# Altium schematic symbol library jlcpcb_2025_04_capacitors_extended_0805.schlib: 3281 symbols (part 5 of 18) (continued)
## AC0805JRNPO0BN100 (continued)

## AC0805JRNPO0BN101
designator C?  Capacitance: 100pF  (hidden comment: *)
Capacitor, Ceramic (MLCC), 100pF, ±5%, 100V, ±5%, SMD 0805; Manufacturer: YAGEO; Manufacturer Part Number: AC0805JRNPO0BN101; Package Size: 0805; JLCPCB Basic Part: No; JLCPCB Part Number: C726569; Supplier 1: LCSC; Category: Capacitors - MLCC; Supplier Part Number 1: C726569; Tolerance: ±5%; Voltage Rating: 100V; RoHS: Yes; ComponentLink1Description: Datasheet; ComponentLink1URL: https://wmsc.lcsc.com/wmsc/upload/file/pdf/v2/lcsc/2105241410_YAGEO-AC0805JRNPO0BN101_C726569.pdf; ComponentLink2Description: JLCPCB Part URL; ComponentLink2URL: https://jlcpcb.com/partdetail/C726569; ComponentLink3Description: LCSC Part URL; ComponentLink3URL: https://lcsc.com/product-detail/Multilayer-Ceramic-Capacitors-MLCC---SMD-SMT_YAGEO-YAGEO-AC0805JRNPO0BN101_C726569.html
footprint CAP-0805 (0805 (2012M) Capacitor)
pins: 1, 2

## AC0805JRNPO0BN102
designator C?  Capacitance: 1nF  (hidden comment: *)
Capacitor, Ceramic (MLCC), 1nF, ±5%, 100V, NP0, ±5%, SMD 0805; Manufacturer: YAGEO; Manufacturer Part Number: AC0805JRNPO0BN102; Package Size: 0805; JLCPCB Basic Part: No; JLCPCB Part Number: C726570; Supplier 1: LCSC; Category: Capacitors - MLCC; Supplier Part Number 1: C726570; Tolerance: ±5%; Voltage Rating: 100V; Temperature Coefficient: NP0; RoHS: Yes; ComponentLink1Description: Datasheet; ComponentLink1URL: https://wmsc.lcsc.com/wmsc/upload/file/pdf/v2/lcsc/2009181007_YAGEO-AC0805JRNPO0BN102_C726570.pdf; ComponentLink2Description: JLCPCB Part URL; ComponentLink2URL: https://jlcpcb.com/partdetail/C726570; ComponentLink3Description: LCSC Part URL; ComponentLink3URL: https://lcsc.com/product-detail/Multilayer-Ceramic-Capacitors-MLCC---SMD-SMT_YAGEO-YAGEO-AC0805JRNPO0BN102_C726570.html
footprint CAP-0805 (0805 (2012M) Capacitor)
pins: 1, 2

## AC0805JRNPO0BN151
designator C?  Capacitance: 150pF  (hidden comment: *)
Capacitor, Ceramic (MLCC), 150pF, ±5%, 100V, NP0, ±5%, SMD 0805; Manufacturer: YAGEO; Manufacturer Part Number: AC0805JRNPO0BN151; Package Size: 0805; JLCPCB Basic Part: No; JLCPCB Part Number: C2216343; Supplier 1: LCSC; Category: Capacitors - MLCC; Supplier Part Number 1: C2216343; Tolerance: ±5%; Voltage Rating: 100V; Temperature Coefficient: NP0; RoHS: Yes; ComponentLink1Description: Datasheet; ComponentLink1URL: https://wmsc.lcsc.com/wmsc/upload/file/pdf/v2/lcsc/2304140030_YAGEO-AC0805JRNPO0BN151_C2216343.pdf; ComponentLink2Description: JLCPCB Part URL; ComponentLink2URL: https://jlcpcb.com/partdetail/C2216343; ComponentLink3Description: LCSC Part URL; ComponentLink3URL: https://lcsc.com/product-detail/Multilayer-Ceramic-Capacitors-MLCC---SMD-SMT_YAGEO-YAGEO-AC0805JRNPO0BN151_C2216343.html
footprint CAP-0805 (0805 (2012M) Capacitor)
pins: 1, 2

## AC0805JRNPO0BN221
designator C?  Capacitance: 220pF  (hidden comment: *)
Capacitor, Ceramic (MLCC), 220pF, ±5%, 100V, NP0, ±5%, SMD 0805; Manufacturer: YAGEO; Manufacturer Part Number: AC0805JRNPO0BN221; Package Size: 0805; JLCPCB Basic Part: No; JLCPCB Part Number: C726571; Supplier 1: LCSC; Category: Capacitors - MLCC; Supplier Part Number 1: C726571; Tolerance: ±5%; Voltage Rating: 100V; Temperature Coefficient: NP0; RoHS: Yes; ComponentLink1Description: Datasheet; ComponentLink1URL: https://wmsc.lcsc.com/wmsc/upload/file/pdf/v2/lcsc/2009181007_YAGEO-AC0805JRNPO0BN221_C726571.pdf; ComponentLink2Description: JLCPCB Part URL; ComponentLink2URL: https://jlcpcb.com/partdetail/C726571; ComponentLink3Description: LCSC Part URL; ComponentLink3URL: https://lcsc.com/product-detail/Multilayer-Ceramic-Capacitors-MLCC---SMD-SMT_YAGEO-YAGEO-AC0805JRNPO0BN221_C726571.html
footprint CAP-0805 (0805 (2012M) Capacitor)
pins: 1, 2

## AC0805JRNPO0BN330
designator C?  Capacitance: 33pF  (hidden comment: *)
Capacitor, Ceramic (MLCC), 33pF, ±5%, 100V, NP0, ±5%, SMD 0805; Manufacturer: YAGEO; Manufacturer Part Number: AC0805JRNPO0BN330; Package Size: 0805; JLCPCB Basic Part: No; JLCPCB Part Number: C2203727; Supplier 1: LCSC; Category: Capacitors - MLCC; Supplier Part Number 1: C2203727; Tolerance: ±5%; Voltage Rating: 100V; Temperature Coefficient: NP0; RoHS: Yes; ComponentLink1Description: Datasheet; ComponentLink1URL: https://wmsc.lcsc.com/wmsc/upload/file/pdf/v2/lcsc/2304140030_YAGEO-AC0805JRNPO0BN330_C2203727.pdf; ComponentLink2Description: JLCPCB Part URL; ComponentLink2URL: https://jlcpcb.com/partdetail/C2203727; ComponentLink3Description: LCSC Part URL; ComponentLink3URL: https://lcsc.com/product-detail/Multilayer-Ceramic-Capacitors-MLCC---SMD-SMT_YAGEO-YAGEO-AC0805JRNPO0BN330_C2203727.html
footprint CAP-0805 (0805 (2012M) Capacitor)
pins: 1, 2

## AC0805JRNPO0BN331
designator C?  Capacitance: 330pF  (hidden comment: *)
Capacitor, Ceramic (MLCC), 330pF, ±5%, 100V, NP0, ±5%, SMD 0805; Manufacturer: YAGEO; Manufacturer Part Number: AC0805JRNPO0BN331; Package Size: 0805; JLCPCB Basic Part: No; JLCPCB Part Number: C149605; Supplier 1: LCSC; Category: Capacitors - MLCC; Supplier Part Number 1: C149605; Tolerance: ±5%; Voltage Rating: 100V; Temperature Coefficient: NP0; RoHS: Yes; ComponentLink1Description: Datasheet; ComponentLink1URL: https://wmsc.lcsc.com/wmsc/upload/file/pdf/v2/lcsc/2304140030_YAGEO-AC0805JRNPO0BN331_C149605.pdf; ComponentLink2Description: JLCPCB Part URL; ComponentLink2URL: https://jlcpcb.com/partdetail/C149605; ComponentLink3Description: LCSC Part URL; ComponentLink3URL: https://lcsc.com/product-detail/Multilayer-Ceramic-Capacitors-MLCC---SMD-SMT_YAGEO-YAGEO-AC0805JRNPO0BN331_C149605.html
footprint CAP-0805 (0805 (2012M) Capacitor)
pins: 1, 2

## AC0805JRNPO0BN470
designator C?  Capacitance: 47pF  (hidden comment: *)
Capacitor, Ceramic (MLCC), 47pF, ±5%, 100V, NP0, ±5%, SMD 0805; Manufacturer: YAGEO; Manufacturer Part Number: AC0805JRNPO0BN470; Package Size: 0805; JLCPCB Basic Part: No; JLCPCB Part Number: C726572; Supplier 1: LCSC; Category: Capacitors - MLCC; Supplier Part Number 1: C726572; Tolerance: ±5%; Voltage Rating: 100V; Temperature Coefficient: NP0; RoHS: Yes; ComponentLink1Description: Datasheet; ComponentLink1URL: https://wmsc.lcsc.com/wmsc/upload/file/pdf/v2/lcsc/2011091835_YAGEO-AC0805JRNPO0BN470_C726572.pdf; ComponentLink2Description: JLCPCB Part URL; ComponentLink2URL: https://jlcpcb.com/partdetail/C726572; ComponentLink3Description: LCSC Part URL; ComponentLink3URL: https://lcsc.com/product-detail/Multilayer-Ceramic-Capacitors-MLCC---SMD-SMT_YAGEO-YAGEO-AC0805JRNPO0BN470_C726572.html
footprint CAP-0805 (0805 (2012M) Capacitor)
pins: 1, 2

## AC0805JRNPO0BN471
designator C?  Capacitance: 470pF  (hidden comment: *)
Capacitor, Ceramic (MLCC), 470pF, ±5%, 100V, NP0, ±5%, SMD 0805; Manufacturer: YAGEO; Manufacturer Part Number: AC0805JRNPO0BN471; Package Size: 0805; JLCPCB Basic Part: No; JLCPCB Part Number: C2173436; Supplier 1: LCSC; Category: Capacitors - MLCC; Supplier Part Number 1: C2173436; Tolerance: ±5%; Voltage Rating: 100V; Temperature Coefficient: NP0; RoHS: Yes; ComponentLink1Description: Datasheet; ComponentLink1URL: https://wmsc.lcsc.com/wmsc/upload/file/pdf/v2/lcsc/2202040630_YAGEO-AC0805JRNPO0BN471_C2173436.pdf; ComponentLink2Description: JLCPCB Part URL; ComponentLink2URL: https://jlcpcb.com/partdetail/C2173436; ComponentLink3Description: LCSC Part URL; ComponentLink3URL: https://lcsc.com/product-detail/Multilayer-Ceramic-Capacitors-MLCC---SMD-SMT_YAGEO-YAGEO-AC0805JRNPO0BN471_C2173436.html
footprint CAP-0805 (0805 (2012M) Capacitor)
pins: 1, 2

## AC0805JRNPO0BN680
designator C?  Capacitance: 68pF  (hidden comment: *)
Capacitor, Ceramic (MLCC), 68pF, ±5%, 100V, NP0, ±5%, SMD 0805; Manufacturer: YAGEO; Manufacturer Part Number: AC0805JRNPO0BN680; Package Size: 0805; JLCPCB Basic Part: No; JLCPCB Part Number: C726573; Supplier 1: LCSC; Category: Capacitors - MLCC; Supplier Part Number 1: C726573; Tolerance: ±5%; Voltage Rating: 100V; Temperature Coefficient: NP0; RoHS: Yes; ComponentLink1Description: Datasheet; ComponentLink1URL: https://wmsc.lcsc.com/wmsc/upload/file/pdf/v2/lcsc/2011091835_YAGEO-AC0805JRNPO0BN680_C726573.pdf; ComponentLink2Description: JLCPCB Part URL; ComponentLink2URL: https://jlcpcb.com/partdetail/C726573; ComponentLink3Description: LCSC Part URL; ComponentLink3URL: https://lcsc.com/product-detail/Multilayer-Ceramic-Capacitors-MLCC---SMD-SMT_YAGEO-YAGEO-AC0805JRNPO0BN680_C726573.html
footprint CAP-0805 (0805 (2012M) Capacitor)
pins: 1, 2

## AC0805JRNPO9BN100
designator C?  Capacitance: 10pF  (hidden comment: *)
Capacitor, Ceramic (MLCC), 10pF, ±5%, 50V, ±5%, SMD 0805; Manufacturer: YAGEO; Manufacturer Part Number: AC0805JRNPO9BN100; Package Size: 0805; JLCPCB Basic Part: No; JLCPCB Part Number: C726574; Supplier 1: LCSC; Category: Capacitors - MLCC; Supplier Part Number 1: C726574; Tolerance: ±5%; Voltage Rating: 50V; RoHS: Yes; ComponentLink1Description: Datasheet; ComponentLink1URL: https://wmsc.lcsc.com/wmsc/upload/file/pdf/v2/lcsc/2012102146_YAGEO-AC0805JRNPO9BN100_C726574.pdf; ComponentLink2Description: JLCPCB Part URL; ComponentLink2URL: https://jlcpcb.com/partdetail/C726574; ComponentLink3Description: LCSC Part URL; ComponentLink3URL: https://lcsc.com/product-detail/Multilayer-Ceramic-Capacitors-MLCC---SMD-SMT_YAGEO-YAGEO-AC0805JRNPO9BN100_C726574.html
footprint CAP-0805 (0805 (2012M) Capacitor)
pins: 1, 2

## AC0805JRNPO9BN101
designator C?  Capacitance: 100pF  (hidden comment: *)
Capacitor, Ceramic (MLCC), 100pF, ±5%, 50V, NP0, ±5%, SMD 0805; Manufacturer: YAGEO; Manufacturer Part Number: AC0805JRNPO9BN101; Package Size: 0805; JLCPCB Basic Part: No; JLCPCB Part Number: C326819; Supplier 1: LCSC; Category: Capacitors - MLCC; Supplier Part Number 1: C326819; Tolerance: ±5%; Voltage Rating: 50V; Temperature Coefficient: NP0; RoHS: Yes; ComponentLink1Description: Datasheet; ComponentLink1URL: https://wmsc.lcsc.com/wmsc/upload/file/pdf/v2/lcsc/1811141234_YAGEO-AC0805JRNPO9BN101_C326819.pdf; ComponentLink2Description: JLCPCB Part URL; ComponentLink2URL: https://jlcpcb.com/partdetail/C326819; ComponentLink3Description: LCSC Part URL; ComponentLink3URL: https://lcsc.com/product-detail/Multilayer-Ceramic-Capacitors-MLCC---SMD-SMT_YAGEO-YAGEO-AC0805JRNPO9BN101_C326819.html
footprint CAP-0805 (0805 (2012M) Capacitor)
pins: 1, 2

## AC0805JRNPO9BN102
designator C?  Capacitance: 1nF  (hidden comment: *)
Capacitor, Ceramic (MLCC), 1nF, ±5%, 50V, ±5%, SMD 0805; Manufacturer: YAGEO; Manufacturer Part Number: AC0805JRNPO9BN102; Package Size: 0805; JLCPCB Basic Part: No; JLCPCB Part Number: C726575; Supplier 1: LCSC; Category: Capacitors - MLCC; Supplier Part Number 1: C726575; Tolerance: ±5%; Voltage Rating: 50V; RoHS: Yes; ComponentLink1Description: Datasheet; ComponentLink1URL: https://wmsc.lcsc.com/wmsc/upload/file/pdf/v2/lcsc/2105241410_YAGEO-AC0805JRNPO9BN102_C726575.pdf; ComponentLink2Description: JLCPCB Part URL; ComponentLink2URL: https://jlcpcb.com/partdetail/C726575; ComponentLink3Description: LCSC Part URL; ComponentLink3URL: https://lcsc.com/product-detail/Multilayer-Ceramic-Capacitors-MLCC---SMD-SMT_YAGEO-YAGEO-AC0805JRNPO9BN102_C726575.html
footprint CAP-0805 (0805 (2012M) Capacitor)
pins: 1, 2

## AC0805JRNPO9BN120
designator C?  Capacitance: 12pF  (hidden comment: *)
Capacitor, Ceramic (MLCC), 12pF, ±5%, 50V, NP0, ±5%, SMD 0805; Manufacturer: YAGEO; Manufacturer Part Number: AC0805JRNPO9BN120; Package Size: 0805; JLCPCB Basic Part: No; JLCPCB Part Number: C2197922; Supplier 1: LCSC; Category: Capacitors - MLCC; Supplier Part Number 1: C2197922; Tolerance: ±5%; Voltage Rating: 50V; Temperature Coefficient: NP0; RoHS: Yes; ComponentLink1Description: Datasheet; ComponentLink1URL: https://wmsc.lcsc.com/wmsc/upload/file/pdf/v2/lcsc/2304140030_YAGEO-AC0805JRNPO9BN120_C2197922.pdf; ComponentLink2Description: JLCPCB Part URL; ComponentLink2URL: https://jlcpcb.com/partdetail/C2197922; ComponentLink3Description: LCSC Part URL; ComponentLink3URL: https://lcsc.com/product-detail/Multilayer-Ceramic-Capacitors-MLCC---SMD-SMT_YAGEO-YAGEO-AC0805JRNPO9BN120_C2197922.html
footprint CAP-0805 (0805 (2012M) Capacitor)
pins: 1, 2

## AC0805JRNPO9BN150
designator C?  Capacitance: 15pF  (hidden comment: *)
Capacitor, Ceramic (MLCC), 15pF, ±5%, 50V, NP0, ±5%, SMD 0805; Manufacturer: YAGEO; Manufacturer Part Number: AC0805JRNPO9BN150; Package Size: 0805; JLCPCB Basic Part: No; JLCPCB Part Number: C705013; Supplier 1: LCSC; Category: Capacitors - MLCC; Supplier Part Number 1: C705013; Tolerance: ±5%; Voltage Rating: 50V; Temperature Coefficient: NP0; RoHS: Yes; ComponentLink1Description: Datasheet; ComponentLink1URL: https://wmsc.lcsc.com/wmsc/upload/file/pdf/v2/lcsc/2304140030_YAGEO-AC0805JRNPO9BN150_C705013.pdf; ComponentLink2Description: JLCPCB Part URL; ComponentLink2URL: https://jlcpcb.com/partdetail/C705013; ComponentLink3Description: LCSC Part URL; ComponentLink3URL: https://lcsc.com/product-detail/Multilayer-Ceramic-Capacitors-MLCC---SMD-SMT_YAGEO-YAGEO-AC0805JRNPO9BN150_C705013.html
footprint CAP-0805 (0805 (2012M) Capacitor)
pins: 1, 2

## AC0805JRNPO9BN151
designator C?  Capacitance: 150pF  (hidden comment: *)
Capacitor, Ceramic (MLCC), 150pF, ±5%, 50V, NP0, ±5%, SMD 0805; Manufacturer: YAGEO; Manufacturer Part Number: AC0805JRNPO9BN151; Package Size: 0805; JLCPCB Basic Part: No; JLCPCB Part Number: C2216334; Supplier 1: LCSC; Category: Capacitors - MLCC; Supplier Part Number 1: C2216334; Tolerance: ±5%; Voltage Rating: 50V; Temperature Coefficient: NP0; RoHS: Yes; ComponentLink1Description: Datasheet; ComponentLink1URL: https://wmsc.lcsc.com/wmsc/upload/file/pdf/v2/lcsc/2304140030_YAGEO-AC0805JRNPO9BN151_C2216334.pdf; ComponentLink2Description: JLCPCB Part URL; ComponentLink2URL: https://jlcpcb.com/partdetail/C2216334; ComponentLink3Description: LCSC Part URL; ComponentLink3URL: https://lcsc.com/product-detail/Multilayer-Ceramic-Capacitors-MLCC---SMD-SMT_YAGEO-YAGEO-AC0805JRNPO9BN151_C2216334.html
footprint CAP-0805 (0805 (2012M) Capacitor)
pins: 1, 2

## AC0805JRNPO9BN180
designator C?  Capacitance: 18pF  (hidden comment: *)
Capacitor, Ceramic (MLCC), 18pF, ±5%, 50V, NP0, ±5%, SMD 0805; Manufacturer: YAGEO; Manufacturer Part Number: AC0805JRNPO9BN180; Package Size: 0805; JLCPCB Basic Part: No; JLCPCB Part Number: C726576; Supplier 1: LCSC; Category: Capacitors - MLCC; Supplier Part Number 1: C726576; Tolerance: ±5%; Voltage Rating: 50V; Temperature Coefficient: NP0; RoHS: Yes; ComponentLink1Description: Datasheet; ComponentLink1URL: https://wmsc.lcsc.com/wmsc/upload/file/pdf/v2/lcsc/2010221004_YAGEO-AC0805JRNPO9BN180_C726576.pdf; ComponentLink2Description: JLCPCB Part URL; ComponentLink2URL: https://jlcpcb.com/partdetail/C726576; ComponentLink3Description: LCSC Part URL; ComponentLink3URL: https://lcsc.com/product-detail/Multilayer-Ceramic-Capacitors-MLCC---SMD-SMT_YAGEO-YAGEO-AC0805JRNPO9BN180_C726576.html
footprint CAP-0805 (0805 (2012M) Capacitor)
pins: 1, 2

## AC0805JRNPO9BN200
designator C?  Capacitance: 20pF  (hidden comment: *)
Capacitor, Ceramic (MLCC), 20pF, ±5%, 50V, NP0, ±5%, SMD 0805; Manufacturer: YAGEO; Manufacturer Part Number: AC0805JRNPO9BN200; Package Size: 0805; JLCPCB Basic Part: No; JLCPCB Part Number: C149606; Supplier 1: LCSC; Category: Capacitors - MLCC; Supplier Part Number 1: C149606; Tolerance: ±5%; Voltage Rating: 50V; Temperature Coefficient: NP0; RoHS: Yes; ComponentLink1Description: Datasheet; ComponentLink1URL: https://wmsc.lcsc.com/wmsc/upload/file/pdf/v2/lcsc/2304140030_YAGEO-AC0805JRNPO9BN200_C149606.pdf; ComponentLink2Description: JLCPCB Part URL; ComponentLink2URL: https://jlcpcb.com/partdetail/C149606; ComponentLink3Description: LCSC Part URL; ComponentLink3URL: https://lcsc.com/product-detail/Multilayer-Ceramic-Capacitors-MLCC---SMD-SMT_YAGEO-YAGEO-AC0805JRNPO9BN200_C149606.html
footprint CAP-0805 (0805 (2012M) Capacitor)
pins: 1, 2

## AC0805JRNPO9BN220
designator C?  Capacitance: 22pF  (hidden comment: *)
Capacitor, Ceramic (MLCC), 22pF, ±5%, 50V, NP0, ±5%, SMD 0805; Manufacturer: YAGEO; Manufacturer Part Number: AC0805JRNPO9BN220; Package Size: 0805; JLCPCB Basic Part: No; JLCPCB Part Number: C149614; Supplier 1: LCSC; Category: Capacitors - MLCC; Supplier Part Number 1: C149614; Tolerance: ±5%; Voltage Rating: 50V; Temperature Coefficient: NP0; RoHS: Yes; ComponentLink1Description: Datasheet; ComponentLink1URL: https://wmsc.lcsc.com/wmsc/upload/file/pdf/v2/lcsc/2304140030_YAGEO-AC0805JRNPO9BN220_C149614.pdf; ComponentLink2Description: JLCPCB Part URL; ComponentLink2URL: https://jlcpcb.com/partdetail/C149614; ComponentLink3Description: LCSC Part URL; ComponentLink3URL: https://lcsc.com/product-detail/Multilayer-Ceramic-Capacitors-MLCC---SMD-SMT_YAGEO-YAGEO-AC0805JRNPO9BN220_C149614.html
footprint CAP-0805 (0805 (2012M) Capacitor)
pins: 1, 2

## AC0805JRNPO9BN270
designator C?  Capacitance: 27pF  (hidden comment: *)
Capacitor, Ceramic (MLCC), 27pF, ±5%, 50V, NP0, ±5%, SMD 0805; Manufacturer: YAGEO; Manufacturer Part Number: AC0805JRNPO9BN270; Package Size: 0805; JLCPCB Basic Part: No; JLCPCB Part Number: C726577; Supplier 1: LCSC; Category: Capacitors - MLCC; Supplier Part Number 1: C726577; Tolerance: ±5%; Voltage Rating: 50V; Temperature Coefficient: NP0; RoHS: Yes; ComponentLink1Description: Datasheet; ComponentLink1URL: https://wmsc.lcsc.com/wmsc/upload/file/pdf/v2/lcsc/2010041434_YAGEO-AC0805JRNPO9BN270_C726577.pdf; ComponentLink2Description: JLCPCB Part URL; ComponentLink2URL: https://jlcpcb.com/partdetail/C726577; ComponentLink3Description: LCSC Part URL; ComponentLink3URL: https://lcsc.com/product-detail/Multilayer-Ceramic-Capacitors-MLCC---SMD-SMT_YAGEO-YAGEO-AC0805JRNPO9BN270_C726577.html
footprint CAP-0805 (0805 (2012M) Capacitor)
pins: 1, 2

## AC0805JRNPO9BN300
designator C?  Capacitance: 30pF  (hidden comment: *)
Capacitor, Ceramic (MLCC), 30pF, ±5%, 50V, NP0, ±5%, SMD 0805; Manufacturer: YAGEO; Manufacturer Part Number: AC0805JRNPO9BN300; Package Size: 0805; JLCPCB Basic Part: No; JLCPCB Part Number: C2206726; Supplier 1: LCSC; Category: Capacitors - MLCC; Supplier Part Number 1: C2206726; Tolerance: ±5%; Voltage Rating: 50V; Temperature Coefficient: NP0; RoHS: Yes; ComponentLink1Description: Datasheet; ComponentLink1URL: https://wmsc.lcsc.com/wmsc/upload/file/pdf/v2/lcsc/2304140030_YAGEO-AC0805JRNPO9BN300_C2206726.pdf; ComponentLink2Description: JLCPCB Part URL; ComponentLink2URL: https://jlcpcb.com/partdetail/C2206726; ComponentLink3Description: LCSC Part URL; ComponentLink3URL: https://lcsc.com/product-detail/Multilayer-Ceramic-Capacitors-MLCC---SMD-SMT_YAGEO-YAGEO-AC0805JRNPO9BN300_C2206726.html
footprint CAP-0805 (0805 (2012M) Capacitor)
pins: 1, 2

## AC0805JRNPO9BN331
designator C?  Capacitance: 330pF  (hidden comment: *)
Capacitor, Ceramic (MLCC), 330pF, ±5%, 50V, NP0, ±5%, SMD 0805; Manufacturer: YAGEO; Manufacturer Part Number: AC0805JRNPO9BN331; Package Size: 0805; JLCPCB Basic Part: No; JLCPCB Part Number: C149609; Supplier 1: LCSC; Category: Capacitors - MLCC; Supplier Part Number 1: C149609; Tolerance: ±5%; Voltage Rating: 50V; Temperature Coefficient: NP0; RoHS: Yes; ComponentLink1Description: Datasheet; ComponentLink1URL: https://wmsc.lcsc.com/wmsc/upload/file/pdf/v2/lcsc/2304140030_YAGEO-AC0805JRNPO9BN331_C149609.pdf; ComponentLink2Description: JLCPCB Part URL; ComponentLink2URL: https://jlcpcb.com/partdetail/C149609; ComponentLink3Description: LCSC Part URL; ComponentLink3URL: https://lcsc.com/product-detail/Multilayer-Ceramic-Capacitors-MLCC---SMD-SMT_YAGEO-YAGEO-AC0805JRNPO9BN331_C149609.html
footprint CAP-0805 (0805 (2012M) Capacitor)
pins: 1, 2

## AC0805JRNPO9BN470
designator C?  Capacitance: 47pF  (hidden comment: *)
Capacitor, Ceramic (MLCC), 47pF, ±5%, 50V, NP0, ±5%, SMD 0805; Manufacturer: YAGEO; Manufacturer Part Number: AC0805JRNPO9BN470; Package Size: 0805; JLCPCB Basic Part: No; JLCPCB Part Number: C149613; Supplier 1: LCSC; Category: Capacitors - MLCC; Supplier Part Number 1: C149613; Tolerance: ±5%; Voltage Rating: 50V; Temperature Coefficient: NP0; RoHS: Yes; ComponentLink1Description: Datasheet; ComponentLink1URL: https://wmsc.lcsc.com/wmsc/upload/file/pdf/v2/lcsc/2304140030_YAGEO-AC0805JRNPO9BN470_C149613.pdf; ComponentLink2Description: JLCPCB Part URL; ComponentLink2URL: https://jlcpcb.com/partdetail/C149613; ComponentLink3Description: LCSC Part URL; ComponentLink3URL: https://lcsc.com/product-detail/Multilayer-Ceramic-Capacitors-MLCC---SMD-SMT_YAGEO-YAGEO-AC0805JRNPO9BN470_C149613.html
footprint CAP-0805 (0805 (2012M) Capacitor)
pins: 1, 2

## AC0805JRNPO9BN471
designator C?  Capacitance: 470pF  (hidden comment: *)
Capacitor, Ceramic (MLCC), 470pF, ±5%, 50V, NP0, ±5%, SMD 0805; Manufacturer: YAGEO; Manufacturer Part Number: AC0805JRNPO9BN471; Package Size: 0805; JLCPCB Basic Part: No; JLCPCB Part Number: C149608; Supplier 1: LCSC; Category: Capacitors - MLCC; Supplier Part Number 1: C149608; Tolerance: ±5%; Voltage Rating: 50V; Temperature Coefficient: NP0; RoHS: Yes; ComponentLink1Description: Datasheet; ComponentLink1URL: https://wmsc.lcsc.com/wmsc/upload/file/pdf/v2/lcsc/2304140030_YAGEO-AC0805JRNPO9BN471_C149608.pdf; ComponentLink2Description: JLCPCB Part URL; ComponentLink2URL: https://jlcpcb.com/partdetail/C149608; ComponentLink3Description: LCSC Part URL; ComponentLink3URL: https://lcsc.com/product-detail/Multilayer-Ceramic-Capacitors-MLCC---SMD-SMT_YAGEO-YAGEO-AC0805JRNPO9BN471_C149608.html
footprint CAP-0805 (0805 (2012M) Capacitor)
pins: 1, 2

## AC0805JRNPO9BN680
designator C?  Capacitance: 68pF  (hidden comment: *)
Capacitor, Ceramic (MLCC), 68pF, ±5%, 50V, NP0, ±5%, SMD 0805; Manufacturer: YAGEO; Manufacturer Part Number: AC0805JRNPO9BN680; Package Size: 0805; JLCPCB Basic Part: No; JLCPCB Part Number: C726578; Supplier 1: LCSC; Category: Capacitors - MLCC; Supplier Part Number 1: C726578; Tolerance: ±5%; Voltage Rating: 50V; Temperature Coefficient: NP0; RoHS: Yes; ComponentLink1Description: Datasheet; ComponentLink1URL: https://wmsc.lcsc.com/wmsc/upload/file/pdf/v2/lcsc/2010041434_YAGEO-AC0805JRNPO9BN680_C726578.pdf; ComponentLink2Description: JLCPCB Part URL; ComponentLink2URL: https://jlcpcb.com/partdetail/C726578; ComponentLink3Description: LCSC Part URL; ComponentLink3URL: https://lcsc.com/product-detail/Multilayer-Ceramic-Capacitors-MLCC---SMD-SMT_YAGEO-YAGEO-AC0805JRNPO9BN680_C726578.html
footprint CAP-0805 (0805 (2012M) Capacitor)
pins: 1, 2

## AC0805JRNPO9BN681
designator C?  Capacitance: 680pF  (hidden comment: *)
Capacitor, Ceramic (MLCC), 680pF, ±5%, 50V, NP0, ±5%, SMD 0805; Manufacturer: YAGEO; Manufacturer Part Number: AC0805JRNPO9BN681; Package Size: 0805; JLCPCB Basic Part: No; JLCPCB Part Number: C2199720; Supplier 1: LCSC; Category: Capacitors - MLCC; Supplier Part Number 1: C2199720; Tolerance: ±5%; Voltage Rating: 50V; Temperature Coefficient: NP0; RoHS: Yes; ComponentLink1Description: Datasheet; ComponentLink1URL: https://wmsc.lcsc.com/wmsc/upload/file/pdf/v2/lcsc/2304140030_YAGEO-AC0805JRNPO9BN681_C2199720.pdf; ComponentLink2Description: JLCPCB Part URL; ComponentLink2URL: https://jlcpcb.com/partdetail/C2199720; ComponentLink3Description: LCSC Part URL; ComponentLink3URL: https://lcsc.com/product-detail/Multilayer-Ceramic-Capacitors-MLCC---SMD-SMT_YAGEO-YAGEO-AC0805JRNPO9BN681_C2199720.html
footprint CAP-0805 (0805 (2012M) Capacitor)
pins: 1, 2

## AC0805JRNPOYBN101
designator C?  Capacitance: 100pF  (hidden comment: *)
Capacitor, Ceramic (MLCC), 100pF, ±5%, 250V, NP0, ±5%, SMD 0805; Manufacturer: YAGEO; Manufacturer Part Number: AC0805JRNPOYBN101; Package Size: 0805; JLCPCB Basic Part: No; JLCPCB Part Number: C2176745; Supplier 1: LCSC; Category: Capacitors - MLCC; Supplier Part Number 1: C2176745; Tolerance: ±5%; Voltage Rating: 250V; Temperature Coefficient: NP0; RoHS: Yes; ComponentLink1Description: Datasheet; ComponentLink1URL: https://wmsc.lcsc.com/wmsc/upload/file/pdf/v2/lcsc/2202040830_YAGEO-AC0805JRNPOYBN101_C2176745.pdf; ComponentLink2Description: JLCPCB Part URL; ComponentLink2URL: https://jlcpcb.com/partdetail/C2176745; ComponentLink3Description: LCSC Part URL; ComponentLink3URL: https://lcsc.com/product-detail/Multilayer-Ceramic-Capacitors-MLCC---SMD-SMT_YAGEO-YAGEO-AC0805JRNPOYBN101_C2176745.html
footprint CAP-0805 (0805 (2012M) Capacitor)
pins: 1, 2

## AC0805JRNPOYBN102
designator C?  Capacitance: 1nF  (hidden comment: *)
Capacitor, Ceramic (MLCC), 1nF, ±5%, 250V, ±5%, SMD 0805; Manufacturer: YAGEO; Manufacturer Part Number: AC0805JRNPOYBN102; Package Size: 0805; JLCPCB Basic Part: No; JLCPCB Part Number: C726579; Supplier 1: LCSC; Category: Capacitors - MLCC; Supplier Part Number 1: C726579; Tolerance: ±5%; Voltage Rating: 250V; RoHS: Yes; ComponentLink1Description: Datasheet; ComponentLink1URL: https://wmsc.lcsc.com/wmsc/upload/file/pdf/v2/lcsc/2105241411_YAGEO-AC0805JRNPOYBN102_C726579.pdf; ComponentLink2Description: JLCPCB Part URL; ComponentLink2URL: https://jlcpcb.com/partdetail/C726579; ComponentLink3Description: LCSC Part URL; ComponentLink3URL: https://lcsc.com/product-detail/Multilayer-Ceramic-Capacitors-MLCC---SMD-SMT_YAGEO-YAGEO-AC0805JRNPOYBN102_C726579.html
footprint CAP-0805 (0805 (2012M) Capacitor)
pins: 1, 2

## AC0805JRNPOYBN221
designator C?  Capacitance: 220pF  (hidden comment: *)
Capacitor, Ceramic (MLCC), 220pF, ±5%, 250V, NP0, ±5%, SMD 0805; Manufacturer: YAGEO; Manufacturer Part Number: AC0805JRNPOYBN221; Package Size: 0805; JLCPCB Basic Part: No; JLCPCB Part Number: C726580; Supplier 1: LCSC; Category: Capacitors - MLCC; Supplier Part Number 1: C726580; Tolerance: ±5%; Voltage Rating: 250V; Temperature Coefficient: NP0; RoHS: Yes; ComponentLink1Description: Datasheet; ComponentLink1URL: https://wmsc.lcsc.com/wmsc/upload/file/pdf/v2/lcsc/2010041434_YAGEO-AC0805JRNPOYBN221_C726580.pdf; ComponentLink2Description: JLCPCB Part URL; ComponentLink2URL: https://jlcpcb.com/partdetail/C726580; ComponentLink3Description: LCSC Part URL; ComponentLink3URL: https://lcsc.com/product-detail/Multilayer-Ceramic-Capacitors-MLCC---SMD-SMT_YAGEO-YAGEO-AC0805JRNPOYBN221_C726580.html
footprint CAP-0805 (0805 (2012M) Capacitor)
pins: 1, 2

## AC0805JRNPOYBN471
designator C?  Capacitance: 470pF  (hidden comment: *)
Capacitor, Ceramic (MLCC), 470pF, ±5%, 250V, C0G, ±5%, SMD 0805; Manufacturer: YAGEO; Manufacturer Part Number: AC0805JRNPOYBN471; Package Size: 0805; JLCPCB Basic Part: No; JLCPCB Part Number: C3832875; Supplier 1: LCSC; Category: Capacitors - MLCC; Supplier Part Number 1: C3832875; Tolerance: ±5%; Voltage Rating: 250V; Temperature Coefficient: C0G; RoHS: Yes; ComponentLink1Description: Datasheet; ComponentLink1URL: https://wmsc.lcsc.com/wmsc/upload/file/pdf/v2/lcsc/2311211113_YAGEO-AC0805JRNPOYBN471_C3832875.pdf; ComponentLink2Description: JLCPCB Part URL; ComponentLink2URL: https://jlcpcb.com/partdetail/C3832875; ComponentLink3Description: LCSC Part URL; ComponentLink3URL: https://lcsc.com/product-detail/Multilayer-Ceramic-Capacitors-MLCC---SMD-SMT_YAGEO-YAGEO-AC0805JRNPOYBN471_C3832875.html
footprint CAP-0805 (0805 (2012M) Capacitor)
pins: 1, 2

## AC0805JRX7R9BB103
designator C?  Capacitance: 10nF  (hidden comment: *)
Capacitor, Ceramic (MLCC), 10nF, ±5%, 50V, X7R, ±5%, SMD 0805; Manufacturer: YAGEO; Manufacturer Part Number: AC0805JRX7R9BB103; Package Size: 0805; JLCPCB Basic Part: No; JLCPCB Part Number: C1853561; Supplier 1: LCSC; Category: Capacitors - MLCC; Supplier Part Number 1: C1853561; Tolerance: ±5%; Voltage Rating: 50V; Temperature Coefficient: X7R; RoHS: Yes; ComponentLink1Description: Datasheet; ComponentLink1URL: https://wmsc.lcsc.com/wmsc/upload/file/pdf/v2/lcsc/2202151130_YAGEO-AC0805JRX7R9BB103_C1853561.pdf; ComponentLink2Description: JLCPCB Part URL; ComponentLink2URL: https://jlcpcb.com/partdetail/C1853561; ComponentLink3Description: LCSC Part URL; ComponentLink3URL: https://lcsc.com/product-detail/Multilayer-Ceramic-Capacitors-MLCC---SMD-SMT_YAGEO-YAGEO-AC0805JRX7R9BB103_C1853561.html
footprint CAP-0805 (0805 (2012M) Capacitor)
pins: 1, 2

## AC0805JRX7R9BB223
designator C?  Capacitance: 22nF  (hidden comment: *)
Capacitor, Ceramic (MLCC), 22nF, ±5%, 50V, X7R, ±5%, SMD 0805; Manufacturer: YAGEO; Manufacturer Part Number: AC0805JRX7R9BB223; Package Size: 0805; JLCPCB Basic Part: No; JLCPCB Part Number: C705014; Supplier 1: LCSC; Category: Capacitors - MLCC; Supplier Part Number 1: C705014; Tolerance: ±5%; Voltage Rating: 50V; Temperature Coefficient: X7R; RoHS: Yes; ComponentLink1Description: Datasheet; ComponentLink1URL: https://wmsc.lcsc.com/wmsc/upload/file/pdf/v2/lcsc/2008201234_YAGEO-AC0805JRX7R9BB223_C705014.pdf; ComponentLink2Description: JLCPCB Part URL; ComponentLink2URL: https://jlcpcb.com/partdetail/C705014; ComponentLink3Description: LCSC Part URL; ComponentLink3URL: https://lcsc.com/product-detail/Multilayer-Ceramic-Capacitors-MLCC---SMD-SMT_YAGEO-YAGEO-AC0805JRX7R9BB223_C705014.html
footprint CAP-0805 (0805 (2012M) Capacitor)
pins: 1, 2

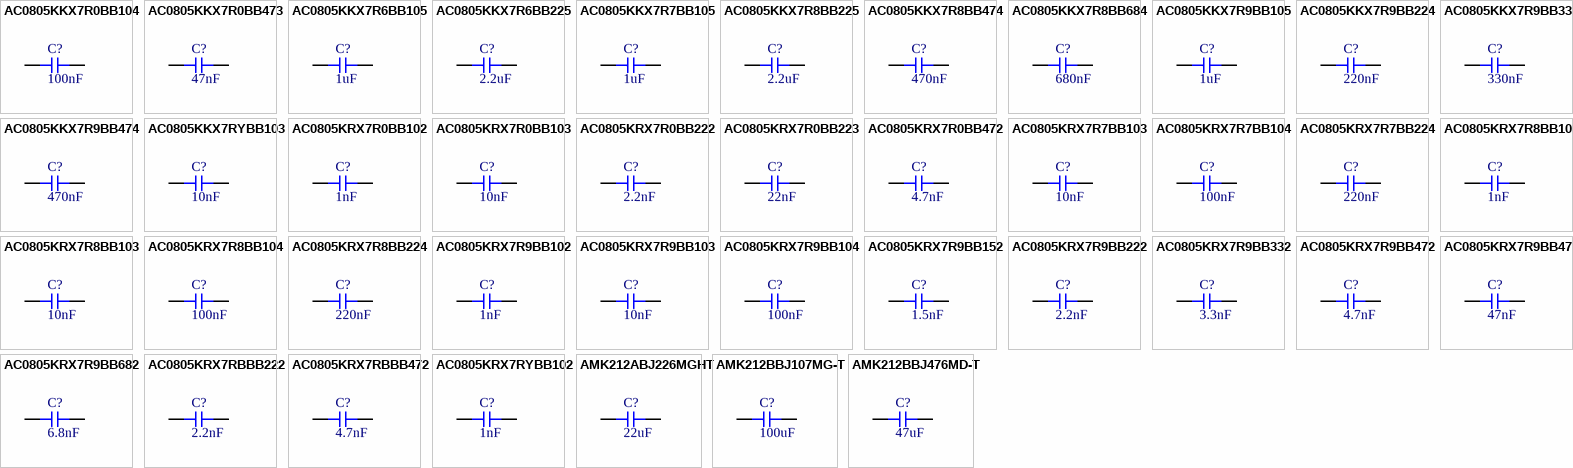
[diagram p21: symbols AC0805KKX7R0BB104 to AMK212BBJ476MD-T]

## AC0805KKX7R0BB104
designator C?  Capacitance: 100nF  (hidden comment: *)
Capacitor, Ceramic (MLCC), 100nF, ±10%, 100V, X7R, ±10%, SMD 0805; Manufacturer: YAGEO; Manufacturer Part Number: AC0805KKX7R0BB104; Package Size: 0805; JLCPCB Basic Part: No; JLCPCB Part Number: C723382; Supplier 1: LCSC; Category: Capacitors - MLCC; Supplier Part Number 1: C723382; Tolerance: ±10%; Voltage Rating: 100V; Temperature Coefficient: X7R; RoHS: Yes; ComponentLink1Description: Datasheet; ComponentLink1URL: https://wmsc.lcsc.com/wmsc/upload/file/pdf/v2/lcsc/2008201235_YAGEO-AC0805KKX7R0BB104_C723382.pdf; ComponentLink2Description: JLCPCB Part URL; ComponentLink2URL: https://jlcpcb.com/partdetail/C723382; ComponentLink3Description: LCSC Part URL; ComponentLink3URL: https://lcsc.com/product-detail/Multilayer-Ceramic-Capacitors-MLCC---SMD-SMT_YAGEO-YAGEO-AC0805KKX7R0BB104_C723382.html
footprint CAP-0805 (0805 (2012M) Capacitor)
pins: 1, 2

## AC0805KKX7R0BB473
designator C?  Capacitance: 47nF  (hidden comment: *)
Capacitor, Ceramic (MLCC), 47nF, ±10%, 100V, X7R, ±10%, SMD 0805; Manufacturer: YAGEO; Manufacturer Part Number: AC0805KKX7R0BB473; Package Size: 0805; JLCPCB Basic Part: No; JLCPCB Part Number: C560862; Supplier 1: LCSC; Category: Capacitors - MLCC; Supplier Part Number 1: C560862; Tolerance: ±10%; Voltage Rating: 100V; Temperature Coefficient: X7R; RoHS: Yes; ComponentLink1Description: Datasheet; ComponentLink1URL: https://wmsc.lcsc.com/wmsc/upload/file/pdf/v2/lcsc/2311211113_YAGEO-AC0805KKX7R0BB473_C560862.pdf; ComponentLink2Description: JLCPCB Part URL; ComponentLink2URL: https://jlcpcb.com/partdetail/C560862; ComponentLink3Description: LCSC Part URL; ComponentLink3URL: https://lcsc.com/product-detail/Multilayer-Ceramic-Capacitors-MLCC---SMD-SMT_YAGEO-YAGEO-AC0805KKX7R0BB473_C560862.html
footprint CAP-0805 (0805 (2012M) Capacitor)
pins: 1, 2

## AC0805KKX7R6BB105
designator C?  Capacitance: 1uF  (hidden comment: *)
Capacitor, Ceramic (MLCC), 1uF, ±10%, 10V, X7R, ±10%, SMD 0805; Manufacturer: YAGEO; Manufacturer Part Number: AC0805KKX7R6BB105; Package Size: 0805; JLCPCB Basic Part: No; JLCPCB Part Number: C726581; Supplier 1: LCSC; Category: Capacitors - MLCC; Supplier Part Number 1: C726581; Tolerance: ±10%; Voltage Rating: 10V; Temperature Coefficient: X7R; RoHS: Yes; ComponentLink1Description: Datasheet; ComponentLink1URL: https://wmsc.lcsc.com/wmsc/upload/file/pdf/v2/lcsc/2304140030_YAGEO-AC0805KKX7R6BB105_C726581.pdf; ComponentLink2Description: JLCPCB Part URL; ComponentLink2URL: https://jlcpcb.com/partdetail/C726581; ComponentLink3Description: LCSC Part URL; ComponentLink3URL: https://lcsc.com/product-detail/Multilayer-Ceramic-Capacitors-MLCC---SMD-SMT_YAGEO-YAGEO-AC0805KKX7R6BB105_C726581.html
footprint CAP-0805 (0805 (2012M) Capacitor)
pins: 1, 2

## AC0805KKX7R6BB225
designator C?  Capacitance: 2.2uF  (hidden comment: *)
Capacitor, Ceramic (MLCC), 2.2uF, ±10%, 10V, X7R, ±10%, SMD 0805; Manufacturer: YAGEO; Manufacturer Part Number: AC0805KKX7R6BB225; Package Size: 0805; JLCPCB Basic Part: No; JLCPCB Part Number: C726582; Supplier 1: LCSC; Category: Capacitors - MLCC; Supplier Part Number 1: C726582; Tolerance: ±10%; Voltage Rating: 10V; Temperature Coefficient: X7R; RoHS: Yes; ComponentLink1Description: Datasheet; ComponentLink1URL: https://wmsc.lcsc.com/wmsc/upload/file/pdf/v2/lcsc/2304140030_YAGEO-AC0805KKX7R6BB225_C726582.pdf; ComponentLink2Description: JLCPCB Part URL; ComponentLink2URL: https://jlcpcb.com/partdetail/C726582; ComponentLink3Description: LCSC Part URL; ComponentLink3URL: https://lcsc.com/product-detail/Multilayer-Ceramic-Capacitors-MLCC---SMD-SMT_YAGEO-YAGEO-AC0805KKX7R6BB225_C726582.html
footprint CAP-0805 (0805 (2012M) Capacitor)
pins: 1, 2

## AC0805KKX7R7BB105
designator C?  Capacitance: 1uF  (hidden comment: *)
Capacitor, Ceramic (MLCC), 1uF, ±10%, 16V, X7R, ±10%, SMD 0805; Manufacturer: YAGEO; Manufacturer Part Number: AC0805KKX7R7BB105; Package Size: 0805; JLCPCB Basic Part: No; JLCPCB Part Number: C2842076; Supplier 1: LCSC; Category: Capacitors - MLCC; Supplier Part Number 1: C2842076; Tolerance: ±10%; Voltage Rating: 16V; Temperature Coefficient: X7R; RoHS: Yes; ComponentLink1Description: Datasheet; ComponentLink1URL: https://wmsc.lcsc.com/wmsc/upload/file/pdf/v2/lcsc/2203221230_YAGEO-AC0805KKX7R7BB105_C2842076.pdf; ComponentLink2Description: JLCPCB Part URL; ComponentLink2URL: https://jlcpcb.com/partdetail/C2842076; ComponentLink3Description: LCSC Part URL; ComponentLink3URL: https://lcsc.com/product-detail/Multilayer-Ceramic-Capacitors-MLCC---SMD-SMT_YAGEO-YAGEO-AC0805KKX7R7BB105_C2842076.html
footprint CAP-0805 (0805 (2012M) Capacitor)
pins: 1, 2

## AC0805KKX7R8BB225
designator C?  Capacitance: 2.2uF  (hidden comment: *)
Capacitor, Ceramic (MLCC), 2.2uF, ±10%, 25V, X7R, ±10%, SMD 0805; Manufacturer: YAGEO; Manufacturer Part Number: AC0805KKX7R8BB225; Package Size: 0805; JLCPCB Basic Part: No; JLCPCB Part Number: C723492; Supplier 1: LCSC; Category: Capacitors - MLCC; Supplier Part Number 1: C723492; Tolerance: ±10%; Voltage Rating: 25V; Temperature Coefficient: X7R; RoHS: Yes; ComponentLink1Description: Datasheet; ComponentLink1URL: https://wmsc.lcsc.com/wmsc/upload/file/pdf/v2/lcsc/2304140030_YAGEO-AC0805KKX7R8BB225_C723492.pdf; ComponentLink2Description: JLCPCB Part URL; ComponentLink2URL: https://jlcpcb.com/partdetail/C723492; ComponentLink3Description: LCSC Part URL; ComponentLink3URL: https://lcsc.com/product-detail/Multilayer-Ceramic-Capacitors-MLCC---SMD-SMT_YAGEO-YAGEO-AC0805KKX7R8BB225_C723492.html
footprint CAP-0805 (0805 (2012M) Capacitor)
pins: 1, 2

## AC0805KKX7R8BB474
designator C?  Capacitance: 470nF  (hidden comment: *)
Capacitor, Ceramic (MLCC), 470nF, ±10%, 25V, X7R, ±10%, SMD 0805; Manufacturer: YAGEO; Manufacturer Part Number: AC0805KKX7R8BB474; Package Size: 0805; JLCPCB Basic Part: No; JLCPCB Part Number: C726583; Supplier 1: LCSC; Category: Capacitors - MLCC; Supplier Part Number 1: C726583; Tolerance: ±10%; Voltage Rating: 25V; Temperature Coefficient: X7R; RoHS: Yes; ComponentLink1Description: Datasheet; ComponentLink1URL: https://wmsc.lcsc.com/wmsc/upload/file/pdf/v2/lcsc/2304140030_YAGEO-AC0805KKX7R8BB474_C726583.pdf; ComponentLink2Description: JLCPCB Part URL; ComponentLink2URL: https://jlcpcb.com/partdetail/C726583; ComponentLink3Description: LCSC Part URL; ComponentLink3URL: https://lcsc.com/product-detail/Multilayer-Ceramic-Capacitors-MLCC---SMD-SMT_YAGEO-YAGEO-AC0805KKX7R8BB474_C726583.html
footprint CAP-0805 (0805 (2012M) Capacitor)
pins: 1, 2

## AC0805KKX7R8BB684
designator C?  Capacitance: 680nF  (hidden comment: *)
Capacitor, Ceramic (MLCC), 680nF, ±10%, 25V, X7R, ±10%, SMD 0805; Manufacturer: YAGEO; Manufacturer Part Number: AC0805KKX7R8BB684; Package Size: 0805; JLCPCB Basic Part: No; JLCPCB Part Number: C723735; Supplier 1: LCSC; Category: Capacitors - MLCC; Supplier Part Number 1: C723735; Tolerance: ±10%; Voltage Rating: 25V; Temperature Coefficient: X7R; RoHS: Yes; ComponentLink1Description: Datasheet; ComponentLink1URL: https://wmsc.lcsc.com/wmsc/upload/file/pdf/v2/lcsc/2008201237_YAGEO-AC0805KKX7R8BB684_C723735.pdf; ComponentLink2Description: JLCPCB Part URL; ComponentLink2URL: https://jlcpcb.com/partdetail/C723735; ComponentLink3Description: LCSC Part URL; ComponentLink3URL: https://lcsc.com/product-detail/Multilayer-Ceramic-Capacitors-MLCC---SMD-SMT_YAGEO-YAGEO-AC0805KKX7R8BB684_C723735.html
footprint CAP-0805 (0805 (2012M) Capacitor)
pins: 1, 2

## AC0805KKX7R9BB105
designator C?  Capacitance: 1uF  (hidden comment: *)
Capacitor, Ceramic (MLCC), 1uF, ±10%, 50V, X7R, ±10%, SMD 0805; Manufacturer: YAGEO; Manufacturer Part Number: AC0805KKX7R9BB105; Package Size: 0805; JLCPCB Basic Part: No; JLCPCB Part Number: C726584; Supplier 1: LCSC; Category: Capacitors - MLCC; Supplier Part Number 1: C726584; Tolerance: ±10%; Voltage Rating: 50V; Temperature Coefficient: X7R; RoHS: Yes; ComponentLink1Description: Datasheet; ComponentLink1URL: https://wmsc.lcsc.com/wmsc/upload/file/pdf/v2/lcsc/2304140030_YAGEO-AC0805KKX7R9BB105_C726584.pdf; ComponentLink2Description: JLCPCB Part URL; ComponentLink2URL: https://jlcpcb.com/partdetail/C726584; ComponentLink3Description: LCSC Part URL; ComponentLink3URL: https://lcsc.com/product-detail/Multilayer-Ceramic-Capacitors-MLCC---SMD-SMT_YAGEO-YAGEO-AC0805KKX7R9BB105_C726584.html
footprint CAP-0805 (0805 (2012M) Capacitor)
pins: 1, 2

## AC0805KKX7R9BB224
designator C?  Capacitance: 220nF  (hidden comment: *)
Capacitor, Ceramic (MLCC), 220nF, ±10%, 50V, X7R, ±10%, SMD 0805; Manufacturer: YAGEO; Manufacturer Part Number: AC0805KKX7R9BB224; Package Size: 0805; JLCPCB Basic Part: No; JLCPCB Part Number: C149604; Supplier 1: LCSC; Category: Capacitors - MLCC; Supplier Part Number 1: C149604; Tolerance: ±10%; Voltage Rating: 50V; Temperature Coefficient: X7R; RoHS: Yes; ComponentLink1Description: Datasheet; ComponentLink1URL: https://wmsc.lcsc.com/wmsc/upload/file/pdf/v2/lcsc/2304140030_YAGEO-AC0805KKX7R9BB224_C149604.pdf; ComponentLink2Description: JLCPCB Part URL; ComponentLink2URL: https://jlcpcb.com/partdetail/C149604; ComponentLink3Description: LCSC Part URL; ComponentLink3URL: https://lcsc.com/product-detail/Multilayer-Ceramic-Capacitors-MLCC---SMD-SMT_YAGEO-YAGEO-AC0805KKX7R9BB224_C149604.html
footprint CAP-0805 (0805 (2012M) Capacitor)
pins: 1, 2

## AC0805KKX7R9BB334
designator C?  Capacitance: 330nF  (hidden comment: *)
Capacitor, Ceramic (MLCC), 330nF, ±10%, 50V, X7R, ±10%, SMD 0805; Manufacturer: YAGEO; Manufacturer Part Number: AC0805KKX7R9BB334; Package Size: 0805; JLCPCB Basic Part: No; JLCPCB Part Number: C726585; Supplier 1: LCSC; Category: Capacitors - MLCC; Supplier Part Number 1: C726585; Tolerance: ±10%; Voltage Rating: 50V; Temperature Coefficient: X7R; RoHS: Yes; ComponentLink1Description: Datasheet; ComponentLink1URL: https://wmsc.lcsc.com/wmsc/upload/file/pdf/v2/lcsc/2304140030_YAGEO-AC0805KKX7R9BB334_C726585.pdf; ComponentLink2Description: JLCPCB Part URL; ComponentLink2URL: https://jlcpcb.com/partdetail/C726585; ComponentLink3Description: LCSC Part URL; ComponentLink3URL: https://lcsc.com/product-detail/Multilayer-Ceramic-Capacitors-MLCC---SMD-SMT_YAGEO-YAGEO-AC0805KKX7R9BB334_C726585.html
footprint CAP-0805 (0805 (2012M) Capacitor)
pins: 1, 2

## AC0805KKX7R9BB474
designator C?  Capacitance: 470nF  (hidden comment: *)
Capacitor, Ceramic (MLCC), 470nF, ±10%, 50V, X7R, ±10%, SMD 0805; Manufacturer: YAGEO; Manufacturer Part Number: AC0805KKX7R9BB474; Package Size: 0805; JLCPCB Basic Part: No; JLCPCB Part Number: C726586; Supplier 1: LCSC; Category: Capacitors - MLCC; Supplier Part Number 1: C726586; Tolerance: ±10%; Voltage Rating: 50V; Temperature Coefficient: X7R; RoHS: Yes; ComponentLink1Description: Datasheet; ComponentLink1URL: https://wmsc.lcsc.com/wmsc/upload/file/pdf/v2/lcsc/2304140030_YAGEO-AC0805KKX7R9BB474_C726586.pdf; ComponentLink2Description: JLCPCB Part URL; ComponentLink2URL: https://jlcpcb.com/partdetail/C726586; ComponentLink3Description: LCSC Part URL; ComponentLink3URL: https://lcsc.com/product-detail/Multilayer-Ceramic-Capacitors-MLCC---SMD-SMT_YAGEO-YAGEO-AC0805KKX7R9BB474_C726586.html
footprint CAP-0805 (0805 (2012M) Capacitor)
pins: 1, 2

## AC0805KKX7RYBB103
designator C?  Capacitance: 10nF  (hidden comment: *)
Capacitor, Ceramic (MLCC), 10nF, ±10%, 250V, X7R, ±10%, SMD 0805; Manufacturer: YAGEO; Manufacturer Part Number: AC0805KKX7RYBB103; Package Size: 0805; JLCPCB Basic Part: No; JLCPCB Part Number: C327011; Supplier 1: LCSC; Category: Capacitors - MLCC; Supplier Part Number 1: C327011; Tolerance: ±10%; Voltage Rating: 250V; Temperature Coefficient: X7R; RoHS: Yes; ComponentLink1Description: Datasheet; ComponentLink1URL: https://wmsc.lcsc.com/wmsc/upload/file/pdf/v2/lcsc/1811141226_YAGEO-AC0805KKX7RYBB103_C327011.pdf; ComponentLink2Description: JLCPCB Part URL; ComponentLink2URL: https://jlcpcb.com/partdetail/C327011; ComponentLink3Description: LCSC Part URL; ComponentLink3URL: https://lcsc.com/product-detail/Multilayer-Ceramic-Capacitors-MLCC---SMD-SMT_YAGEO-YAGEO-AC0805KKX7RYBB103_C327011.html
footprint CAP-0805 (0805 (2012M) Capacitor)
pins: 1, 2

## AC0805KRX7R0BB102
designator C?  Capacitance: 1nF  (hidden comment: *)
Capacitor, Ceramic (MLCC), 1nF, ±10%, 100V, X7R, ±10%, SMD 0805; Manufacturer: YAGEO; Manufacturer Part Number: AC0805KRX7R0BB102; Package Size: 0805; JLCPCB Basic Part: No; JLCPCB Part Number: C726587; Supplier 1: LCSC; Category: Capacitors - MLCC; Supplier Part Number 1: C726587; Tolerance: ±10%; Voltage Rating: 100V; Temperature Coefficient: X7R; RoHS: Yes; ComponentLink1Description: Datasheet; ComponentLink1URL: https://wmsc.lcsc.com/wmsc/upload/file/pdf/v2/lcsc/2304140030_YAGEO-AC0805KRX7R0BB102_C726587.pdf; ComponentLink2Description: JLCPCB Part URL; ComponentLink2URL: https://jlcpcb.com/partdetail/C726587; ComponentLink3Description: LCSC Part URL; ComponentLink3URL: https://lcsc.com/product-detail/Multilayer-Ceramic-Capacitors-MLCC---SMD-SMT_YAGEO-YAGEO-AC0805KRX7R0BB102_C726587.html
footprint CAP-0805 (0805 (2012M) Capacitor)
pins: 1, 2

## AC0805KRX7R0BB103
designator C?  Capacitance: 10nF  (hidden comment: *)
Capacitor, Ceramic (MLCC), 10nF, ±10%, 100V, X7R, ±10%, SMD 0805; Manufacturer: YAGEO; Manufacturer Part Number: AC0805KRX7R0BB103; Package Size: 0805; JLCPCB Basic Part: No; JLCPCB Part Number: C723703; Supplier 1: LCSC; Category: Capacitors - MLCC; Supplier Part Number 1: C723703; Tolerance: ±10%; Voltage Rating: 100V; Temperature Coefficient: X7R; RoHS: Yes; ComponentLink1Description: Datasheet; ComponentLink1URL: https://wmsc.lcsc.com/wmsc/upload/file/pdf/v2/lcsc/2201131100_YAGEO-AC0805KRX7R0BB103_C723703.pdf; ComponentLink2Description: JLCPCB Part URL; ComponentLink2URL: https://jlcpcb.com/partdetail/C723703; ComponentLink3Description: LCSC Part URL; ComponentLink3URL: https://lcsc.com/product-detail/Multilayer-Ceramic-Capacitors-MLCC---SMD-SMT_YAGEO-YAGEO-AC0805KRX7R0BB103_C723703.html
footprint CAP-0805 (0805 (2012M) Capacitor)
pins: 1, 2

## AC0805KRX7R0BB222
designator C?  Capacitance: 2.2nF  (hidden comment: *)
Capacitor, Ceramic (MLCC), 2.2nF, ±10%, 100V, X7R, ±10%, SMD 0805; Manufacturer: YAGEO; Manufacturer Part Number: AC0805KRX7R0BB222; Package Size: 0805; JLCPCB Basic Part: No; JLCPCB Part Number: C726588; Supplier 1: LCSC; Category: Capacitors - MLCC; Supplier Part Number 1: C726588; Tolerance: ±10%; Voltage Rating: 100V; Temperature Coefficient: X7R; RoHS: Yes; ComponentLink1Description: Datasheet; ComponentLink1URL: https://wmsc.lcsc.com/wmsc/upload/file/pdf/v2/lcsc/2304140030_YAGEO-AC0805KRX7R0BB222_C726588.pdf; ComponentLink2Description: JLCPCB Part URL; ComponentLink2URL: https://jlcpcb.com/partdetail/C726588; ComponentLink3Description: LCSC Part URL; ComponentLink3URL: https://lcsc.com/product-detail/Multilayer-Ceramic-Capacitors-MLCC---SMD-SMT_YAGEO-YAGEO-AC0805KRX7R0BB222_C726588.html
footprint CAP-0805 (0805 (2012M) Capacitor)
pins: 1, 2

## AC0805KRX7R0BB223
designator C?  Capacitance: 22nF  (hidden comment: *)
Capacitor, Ceramic (MLCC), 22nF, ±10%, 100V, X7R, ±10%, SMD 0805; Manufacturer: YAGEO; Manufacturer Part Number: AC0805KRX7R0BB223; Package Size: 0805; JLCPCB Basic Part: No; JLCPCB Part Number: C726589; Supplier 1: LCSC; Category: Capacitors - MLCC; Supplier Part Number 1: C726589; Tolerance: ±10%; Voltage Rating: 100V; Temperature Coefficient: X7R; RoHS: Yes; ComponentLink1Description: Datasheet; ComponentLink1URL: https://wmsc.lcsc.com/wmsc/upload/file/pdf/v2/lcsc/2304140030_YAGEO-AC0805KRX7R0BB223_C726589.pdf; ComponentLink2Description: JLCPCB Part URL; ComponentLink2URL: https://jlcpcb.com/partdetail/C726589; ComponentLink3Description: LCSC Part URL; ComponentLink3URL: https://lcsc.com/product-detail/Multilayer-Ceramic-Capacitors-MLCC---SMD-SMT_YAGEO-YAGEO-AC0805KRX7R0BB223_C726589.html
footprint CAP-0805 (0805 (2012M) Capacitor)
pins: 1, 2

## AC0805KRX7R0BB472
designator C?  Capacitance: 4.7nF  (hidden comment: *)
Capacitor, Ceramic (MLCC), 4.7nF, ±10%, 100V, X7R, ±10%, SMD 0805; Manufacturer: YAGEO; Manufacturer Part Number: AC0805KRX7R0BB472; Package Size: 0805; JLCPCB Basic Part: No; JLCPCB Part Number: C726590; Supplier 1: LCSC; Category: Capacitors - MLCC; Supplier Part Number 1: C726590; Tolerance: ±10%; Voltage Rating: 100V; Temperature Coefficient: X7R; RoHS: Yes; ComponentLink1Description: Datasheet; ComponentLink1URL: https://wmsc.lcsc.com/wmsc/upload/file/pdf/v2/lcsc/2304140030_YAGEO-AC0805KRX7R0BB472_C726590.pdf; ComponentLink2Description: JLCPCB Part URL; ComponentLink2URL: https://jlcpcb.com/partdetail/C726590; ComponentLink3Description: LCSC Part URL; ComponentLink3URL: https://lcsc.com/product-detail/Multilayer-Ceramic-Capacitors-MLCC---SMD-SMT_YAGEO-YAGEO-AC0805KRX7R0BB472_C726590.html
footprint CAP-0805 (0805 (2012M) Capacitor)
pins: 1, 2

## AC0805KRX7R7BB103
designator C?  Capacitance: 10nF  (hidden comment: *)
Capacitor, Ceramic (MLCC), 10nF, ±10%, 16V, X7R, ±10%, SMD 0805; Manufacturer: YAGEO; Manufacturer Part Number: AC0805KRX7R7BB103; Package Size: 0805; JLCPCB Basic Part: No; JLCPCB Part Number: C2169181; Supplier 1: LCSC; Category: Capacitors - MLCC; Supplier Part Number 1: C2169181; Tolerance: ±10%; Voltage Rating: 16V; Temperature Coefficient: X7R; RoHS: Yes; ComponentLink1Description: Datasheet; ComponentLink1URL: https://wmsc.lcsc.com/wmsc/upload/file/pdf/v2/lcsc/2202040330_YAGEO-AC0805KRX7R7BB103_C2169181.pdf; ComponentLink2Description: JLCPCB Part URL; ComponentLink2URL: https://jlcpcb.com/partdetail/C2169181; ComponentLink3Description: LCSC Part URL; ComponentLink3URL: https://lcsc.com/product-detail/Multilayer-Ceramic-Capacitors-MLCC---SMD-SMT_YAGEO-YAGEO-AC0805KRX7R7BB103_C2169181.html
footprint CAP-0805 (0805 (2012M) Capacitor)
pins: 1, 2
